# Altium footprint library PERCRO_footprints.PcbLib: 177 footprints (part 11 of 12)
Each footprint in its own frame and in the unit in brackets; x right, y up, seen from the top. Pads: shape width x height; smd on the part's side, far side on the other; paste and mask are expansions set on the pad; w line width, h text height; cw(c..) or ccw(c..) is an arc to the next point about the centre after c.
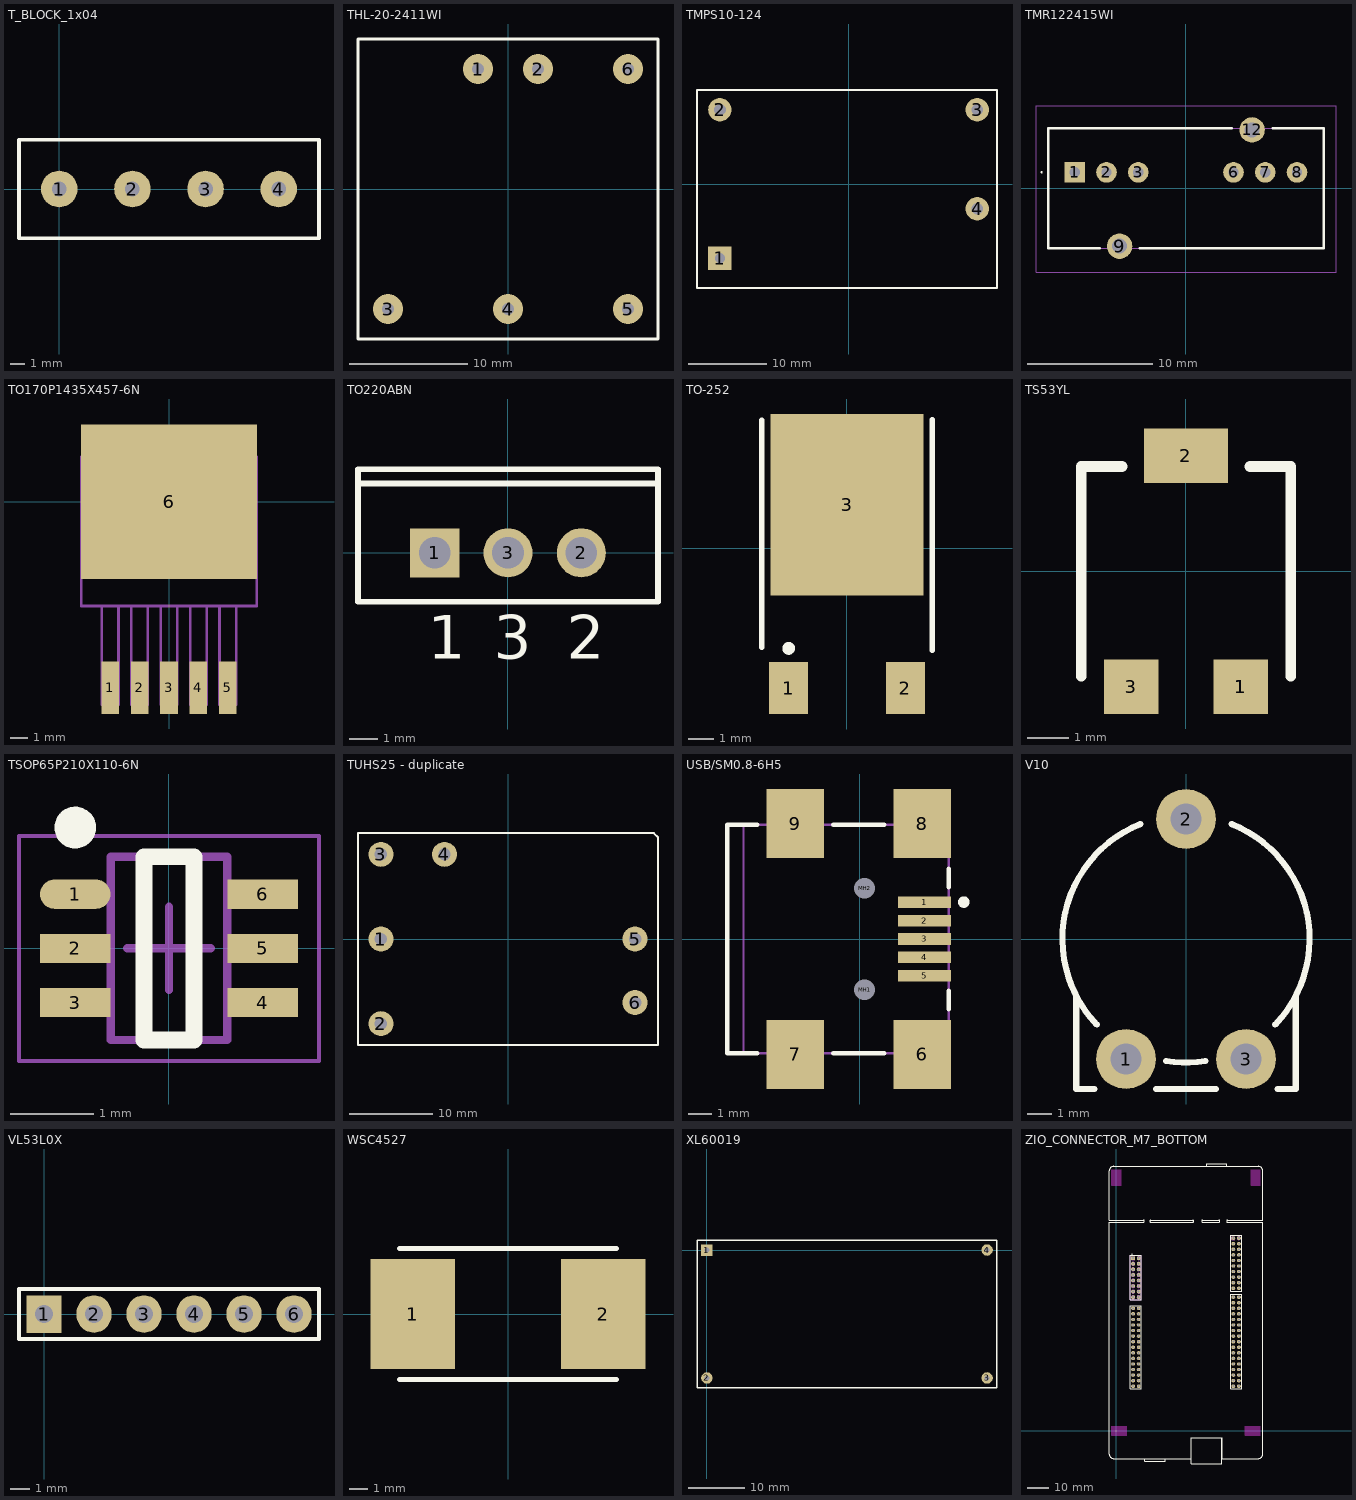
[diagram p10: the footprints below, top view; thin cyan lines are the x and y axes]

## T_BLOCK_1x04 [mil] "Terminal block 1x4"
pads (4):
  round 100 hole 40: 1(0,0) 2(200,0) 3(400,0) 4(600,0)
Top Overlay:
  lines w10: -110,-5 -110,135 710,135 710,-135 243.75,-135 50,-135 -110,-135 -110,30

## THL-20-2411WI [mil] "DC/DC Converter Vout 5v"
pads (6):
  round 100 hole 40: 1(-100,400) 2(100,400) 3(-400,-400) 4(0,-400) 5(400,-400) 6(400,400)
Top Overlay:
  lines w10: -500,-500 -500,500 500,500 500,-500 -500,-500
3D body: height 401.57, standoff 0, extent -500,-500 500,500

## TMPS10-124 [mm] "AC to DC converter"
pads (4):
  rect 3x3 hole 1.3: 1(-16.51,-9.525)
  round 3 hole 1.5: 2(-16.51,9.525) 3(16.51,9.525) 4(16.51,-3.175)
Top Overlay:
  lines w0.254: -19.05,12.065 -16.51,12.065 ; -19.45,-13.335 -19.45,12.065 19.05,12.065 19.05,-13.335 -19.45,-13.335
3D body: height 15.24, standoff 0, extent -19.45,-13.335 19.05,12.065

## TMR122415WI [mil]
pads (8):
  rect 65x65 hole 33: 1(-350,49.61)
  round 65 hole 33: 2(-250,49.61) 3(-150,49.61) 6(150,49.61) 7(250,49.61) 8(350,49.61)
  round 80 hole 47.24: 9(-208.66,-183.07) 12(208.66,183.07)
Top Overlay:
  lines w3.94: -456.3,49.61 ccw(c-454.33,49.61) -452.36,49.61 ccw(c-454.33,49.61) -456.3,49.61
  lines w7.87: -271.26,-188.98 -432.68,-188.98 -432.68,188.98 145,188.98 ; -146,-188.98 433.46,-188.98 433.46,188.98 273,188.98
Mechanical 15:
  lines w3.94: -432.68,-188.98 -432.68,188.98 433.46,188.98 433.46,-188.98 -432.68,-188.98
Mechanical 20:
  lines w3.94: -472.05,-264.96 -472.05,259.06 472.83,259.06 472.83,-264.96 -472.05,-264.96
3D body "TMR_12-2415WI.stp": height 472.44, standoff -161.42, extent -433.07,-188.97 433.08,188.98

## TO170P1435X457-6N [mil]
pads (6):
  rect 40x120.08 smd: 1(-134,-423) 2(-67,-423) 3(0,-423) 4(67,-423) 5(134,-423)
  rect 400x352 smd: 6(0,0)
Mechanical 4:
  lines w6: -200,-237 200,-237 ; -200,-237 -200,103 ; -200,-237 200,-237 ; -200,-237 -200,103 ; -200,103 200,103 ; -200,103 200,103 ; -153,-462 -153,-237 ; -153,-462 -115,-462 ; -153,-462 -153,-237 ; -153,-462 -115,-462 ; -153,-237 -115,-237 ; -153,-237 -115,-237 ; -115,-462 -115,-237 ; -115,-462 -115,-237 ; -86,-462 -86,-237 ; -86,-462 -48,-462 ; -86,-462 -86,-237 ; -86,-462 -48,-462 ; -86,-237 -48,-237 ; -86,-237 -48,-237 ; -48,-462 -48,-237 ; -48,-462 -48,-237 ; -19,-462 -19,-237 ; -19,-462 19,-462 ; -19,-462 -19,-237 ; -19,-462 19,-462 ; -19,-237 19,-237 ; -19,-237 19,-237 ; 19,-462 19,-237 ; 19,-462 19,-237 ; 48,-462 48,-237 ; 48,-462 86,-462 ; 48,-462 48,-237 ; 48,-462 86,-462 ; 48,-237 86,-237 ; 48,-237 86,-237 ; 86,-462 86,-237 ; 86,-462 86,-237 ; 115,-462 115,-237 ; 115,-462 153,-462 ; 115,-462 115,-237 ; 115,-462 153,-462 ; 115,-237 153,-237 ; 115,-237 153,-237 ; 153,-462 153,-237 ; 153,-462 153,-237 ; 200,-237 200,103 ; 200,-237 200,103
3D body "TO263-5.STEP": height 188.98, standoff 0, extent -196.85,-455 196.85,161.93

## TO220ABN [mm] "TO, Thru-Hole, Vertical, Heatsink Mounted; 3 In-Line Leads; Pitch 2.54 mm; Pin sequence 1, 3, 2"
height 19.7
pads (3):
  rect 1.7x1.7 hole 1.1: 1(-2.54,0)
  round 1.7 hole 1.1: 2(2.54,0) 3(0,0)
Top Overlay:
  lines w0.2: -5.2,2.4 5.2,2.4 ; -5.2,-1.7 -5.2,2.9 5.2,2.9 5.2,-1.7 -5.2,-1.7
  text "1" at -2.79,-3.675 h1.5
  text "2" at 2.04,-3.675 h1.5
  text "3" at -0.5,-3.675 h1.5
3D body "TO-220.STEP": height 23.4, standoff -5.4, extent -5.138,-1.75 5.062,2.75

## TO-252 [mil]
pads (3):
  rect 60x80 smd: 1(-89.92,-215.77) 2(90,-215.77)
  rect 236.53x279.53 smd: 3(0.04,66.92)
Top Overlay:
  circle w9.84: c-89.92,-154.62 r4.92
  lines w7.87: -131.41,-152.93 -131.41,197.62 ; 131.5,-157.93 131.5,197.74
3D body "TO-252.STEP": height 95.08, standoff 0, extent -128.73,-228.76 128.75,162.51

## TS53YL [mm] "Trimmer footprint"
pads (4):
  rect 1.3x1.3 smd: 1(1.3,-2.75) 1(1.3,-2.75) 3(-1.3,-2.75)
  rect 2x1.3 smd: 2(0,2.75)
Top Overlay:
  lines w0.254: -2.5,-2.5 -2.5,2.5 -1.524,2.5 ; 1.524,2.5 2.5,2.5 2.5,-2.5

## TSOP65P210X110-6N [mm] "TSOP, 6-Leads, Body 2.00x1.25mm, Pitch 0.65mm, IPC Medium Density"
height 1.1
pads (6):
  oval 0.85x0.35 smd: 1(-1.125,0.65)
  rect 0.85x0.35 smd: 2(-1.125,0) 3(-1.125,-0.65) 4(1.125,-0.65) 5(1.125,0) 6(1.125,0.65)
Top Overlay:
  circle w0.25: c-1.125,1.45 r0.125
  lines w0.2: -0.3,-1.1 -0.3,1.1 0.3,1.1 0.3,-1.1 -0.3,-1.1
Mechanical 13:
  lines w0.1: -0.7,-1.1 -0.7,1.1 0.7,1.1 0.7,-1.1 -0.7,-1.1
Mechanical 15:
  lines w0.05: -1.8,-1.35 -1.8,1.35 1.8,1.35 1.8,-1.35 -1.8,-1.35
  lines w0.1: -0.5,0 0.5,0 ; 0,-0.5 0,0.5
3D body: height 1.1, standoff 0.1, extent -0.7,-1.1 0.7,1.1

## TUHS25 - duplicate [mm] "AC to DC converter"
pads (6):
  round 3 hole 1.5: 1(-15.24,0) 2(-15.24,-10.16) 3(-15.24,10.16) 4(-7.62,10.16) 5(15.24,0) 6(15.24,-7.62)
Top Overlay:
  lines w0.254: -18,-12.7 -18,12.7 17.492,12.7 18,12.192 18,-12.7 -18,-12.7
3D body: height 16.5, standoff 0, extent -18.009,-12.7 18.009,12.7

## USB/SM0.8-6H5 [mm] "MINI USB"
pads (11):
  rect 2.3x0.5 smd: 1(2.8,1.6) 2(2.8,0.8) 3(2.8,0) 4(2.8,-0.8) 5(2.8,-1.6)
  rect 2.5x3 smd: 6(2.7,-5) 7(-2.8,-5) 8(2.7,5) 9(-2.8,5)
  round 0.6 hole 0.9 unplated: MH1(0.2,-2.2) MH2(0.2,2.2)
Top Overlay:
  circle w0.25: c4.5,1.6 r0.125
  lines w0.2: -4.45,-4.95 -5.75,-4.95 -5.75,4.95 -4.45,4.95 ; -1.15,-4.95 1.05,-4.95 ; -1.15,4.95 1.05,4.95 ; 3.85,-3.05 3.85,-2.25 ; 3.85,2.25 3.85,3.05
Mechanical 1:
  lines w0.1: -5.05,-4.95 -5.05,4.95
Mechanical 13:
  lines w0.1: -5.75,-4.95 -5.75,4.95 3.85,4.95 3.85,-4.95 -5.75,-4.95
3D body: height 3.9, standoff 0, extent -5.75,-4.95 3.85,4.95

## V10 [mm] "Trimmer PT10 footprint V10"
pads (3):
  round 2.5 hole 1.3: 1(-2.5,-5) 2(0,5) 3(2.5,-5)
Top Overlay:
  lines w0.254: -4.572,-2.413 -4.572,-6.25 -3.81,-6.25 ; -3.712,-3.57 cw(c0,0) -1.891,4.79 ; -1.25,-6.25 1.25,-6.25 ; -0.824,-5.084 ccw(c0,0) 0.803,-5.087 ; 1.891,4.79 cw(c0,0) 3.712,-3.57 ; 3.81,-6.25 4.572,-6.25 4.572,-2.413
3D body "User Library-PT10LV.STEP": height 6.26, standoff -3.5, extent -5.15,-5.069 5.15,5.531

## VL53L0X [mil]
pads (6):
  rect 70x75 hole 35.43: 1(0,0)
  oval 70x75 hole 35.43: 2(100,0) 3(200,0) 4(300,0) 5(400,0) 6(500,0)
Top Overlay:
  lines w7.87: -50,-50 550,-50 550,50 -50,50 -50,-50

## WSC4527 [mm]
height 4.24
pads (2):
  rect 4.5x5.84 smd: 1(-5.08,0) 2(5.08,0)
Top Overlay:
  lines w0.254: -5.8,-3.5 5.8,-3.5 ; -5.8,3.5 5.8,3.5
3D body: height 4.3, standoff 0, extent -5.817,-3.531 5.817,3.48

## XL60019 [mil] "Regulator Step-up 20W"
pads (4):
  rect 80x80 hole 35.43: 1(0,0)
  round 80 hole 35.43: 2(0,-890.16) 3(1948.82,-890.16) 4(1948.82,0)
Top Overlay:
  lines w10: -68.9,-959.06 2017.72,-959.06 2017.72,68.9 -68.9,68.9 -68.9,-959.06
3D body "Step_up_XL6019.STEP": height 519.12, standoff 0, extent -68.9,-959.06 2017.71,68.9

## ZIO_CONNECTOR_M7_BOTTOM [mil] "Footprint to use a PCB under the NUCLEO"
pads (100):
  rect 70x60 hole 35: 1(300,3100)
  oval 70x60 hole 35: 2(400,3100) 3(300,3000) 4(400,3000) 5(300,2900) 6(400,2900) 7(300,2800) 8(400,2800) 9(300,2700) 10(400,2700) 11(300,2600) 12(400,2600) 13(300,2500) 14(400,2500) 15(300,2400) 16(400,2400) 17(300,2200) 18(400,2200) 19(300,2100) 20(400,2100) 21(300,2000) 22(400,2000) 23(300,1900) 24(400,1900) 25(300,1800) 26(400,1800) 27(300,1700) 28(400,1700) 29(300,1600) 30(400,1600) 31(300,1500) 32(400,1500) 33(300,1400) 34(400,1400) 35(300,1300) 36(400,1300) 37(300,1200) 38(400,1200) 39(300,1100) 40(400,1100) 41(300,1000) 42(400,1000) 43(300,900) 44(400,900) 45(300,800) 46(400,800) 47(2100,3460) 48(2200,3460) 49(2100,3360) 50(2200,3360) 51(2100,3260) 52(2200,3260) 53(2100,3160) 54(2200,3160) 55(2100,3060) 56(2200,3060) 57(2100,2960) 58(2200,2960) 59(2100,2860) 60(2200,2860) 61(2100,2760) 62(2200,2760) 63(2100,2660) 64(2200,2660) 65(2100,2560) 66(2200,2560) 67(2100,2400) 68(2200,2400) 69(2100,2300) 70(2200,2300) 71(2100,2200) 72(2200,2200) 73(2100,2100) 74(2200,2100) 75(2100,2000) 76(2200,2000) 77(2100,1900) 78(2200,1900) 79(2100,1800) 80(2200,1800) 81(2100,1700) 82(2200,1700) 83(2100,1600) 84(2200,1600) 85(2100,1500) 86(2200,1500) 87(2100,1400) 88(2200,1400) 89(2100,1300) 90(2200,1300) 91(2100,1200) 92(2200,1200) 93(2100,1100) 94(2200,1100) 95(2100,1000) 96(2200,1000) 97(2100,900) 98(2200,900) 99(2100,800) 100(2200,800)
Top Overlay:
  circle w9.84: c281.69,3172 r2.31
  lines w7.87: 250,750 250,2250 450,2250 450,750 250,750 ; 250,2350 450,2350 450,3150 250,3150 250,2350 ; 2050,750 2250,750 2250,2450 2050,2450 2050,750 ; 2050,2510 2250,2510 2250,3510 2050,3510 2050,2510
  lines w10: -49.37,-500.04 1340,-500.04 1340,-125.16 1898,-125.16 1898,-500.04 2549.06,-500.04 ; -49.21,-500 cw(c-49.21,-421.26) -127.95,-421.26 -127.95,3745.67 482.28,3745.67 ccw(c482.28,3765.35) 482.28,3785.04 -127.95,3785.04 -127.95,4670.87 cw(c-49.21,4670.87) -49.21,4749.61 2549.21,4749.61 cw(c2549.21,4670.87) 2627.95,4670.87 ; 510.9,-499.89 510.9,-544.66 873.1,-544.66 873.1,-499.89 ; 1343.41,-125.16 1343.41,-597.6 1894.59,-597.6 1894.59,-125.16 ; 1618.9,4747.89 1618.9,4792.66 1981.1,4792.66 1981.1,4747.89 ; 2549.06,-499.84 ccw(c2549.06,-421.1) 2627.8,-421.1 ; 2627.95,-421.26 2627.95,3745.67 1998.03,3745.67 cw(c1998.03,3765.35) 1998.03,3785.04 2627.95,3785.04 2627.95,4670.87 ; 2627.95,4670.87 2627.95,4670.87 ; 620.08,3745.67 cw(c620.08,3765.35) 620.08,3785.04 1368.11,3785.04 cw(c1368.11,3765.35) 1368.11,3745.67 620.08,3745.67 ; 1550,3745.67 cw(c1550,3765.35) 1550,3785.04 1838.58,3785.04 cw(c1838.58,3765.35) 1838.58,3745.67 1550,3745.67
Keep-Out Layer:
  board cut-out: 2420,4690 2587.32,4690 2587.32,4414.8 2420,4414.8
  board cut-out: -80,4687.6 87.32,4687.6 87.32,4412.4 -80,4412.4
  board cut-out: -88,-82.32 -88,85 187.2,85 187.2,-82.32
  board cut-out: 2312,-83.32 2312,84 2587.2,84 2587.2,-83.32
Keep-Out Layer:
  lines w10: -88,-82.32 187.2,-82.32 187.2,85 -88,85 -88,-82.32 ; -80,4412.4 87.32,4412.4 87.32,4687.6 -80,4687.6 -80,4412.4 ; 2312,-83.32 2587.2,-83.32 2587.2,84 2312,84 2312,-83.32 ; 2420,4412.4 2420,4687.6 2587.32,4687.6 2587.32,4412.4 2420,4412.4
Mechanical 7:
  circle w7.87: c400,2500 r26.93
  circle w7.87: c400,2400 r26.93
  circle w7.87: c300,2400 r26.93
  circle w7.87: c300,2500 r26.93
  circle w7.87: c300,3000 r26.93
  circle w7.87: c300,2900 r26.93
  circle w7.87: c300,2800 r26.93
  circle w7.87: c300,2700 r26.93
  circle w7.87: c300,2600 r26.93
  circle w7.87: c400,2600 r26.93
  circle w7.87: c400,2700 r26.93
  circle w7.87: c400,2800 r26.93
  circle w7.87: c400,2900 r26.93
  circle w7.87: c400,3000 r26.93
  circle w7.87: c400,3100 r26.93
  circle w7.87: c2200,3460 r26.93
  lines w7.87: 250,2350 450,2350 450,3150 250,3150 250,2350 ; 275,3075 275,3125 325,3125 325,3075 275,3075 ; 2050,2510 2250,2510 2250,3510 2050,3510 2050,2510 ; 2075,3435 2125,3435 2125,3485 2075,3485 2075,3435
3D body "header_2x10.stp": height 236.22, standoff -263.78, extent 2006.3,2511.98 2248.43,3511.98
3D body "header_2x15.stp": height 236.22, standoff -263.78, extent 251.58,748.04 493.71,2248.04
3D body "header_2x17.stp": height 236.22, standoff -263.78, extent 2006.3,751.98 2248.43,2451.98
3D body "header_2x8.stp": height 236.22, standoff -263.78, extent 251.58,2348.04 493.71,3148.04
3D body "PCB_NUCLEO.step": height 749.61, standoff -207.09, extent -130.85,-597.64 2630.86,4789.96